# Altium integrated library AltiumLib.IntLib: 68 symbols
Pins are listed as number, name and electrical type; pins without a type are passive.

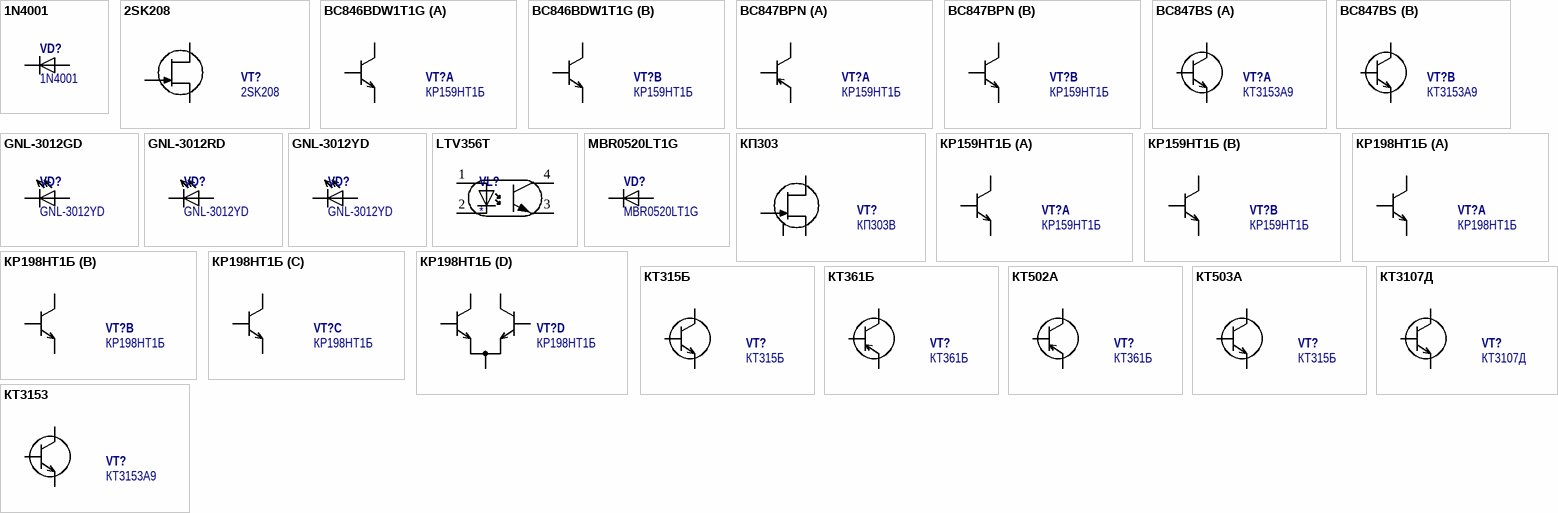
[diagram p0: symbols 1N4001 to КТ3153]

## 1N4001
designator VD?
name: Диод 1N4001; type: Диоды; def_comment: 1N4001
footprint D-015
pins: 1, 2

## 2SK208
designator VT?
N-транзистор; name: Транзистор 2SK208; type: Транзисторы; def_comment: 2SK208
footprint SOT95P230X110-3N (SOT23, 3-Leads, Body 2,90x2,30mm, Pitch 0,95mm, IPC Medium Density)
pins: 1 S, 2 D, 3 G

## BC846BDW1T1G
designator VT?, comment КР159НТ1Б
сборка 2 NPN-транзистора; name: Транзистор BC846BDW1T1G; type: Транзисторы; def_comment: КР159НТ1Б
footprint SOT65P210X110-6N (SOT23, 6-Leads, Body 2,00x2,10mm, Pitch 0,65mm, IPC Medium Density)
part A pins: 3 К, 4 Э, 5 Б
part B pins: 1 Э, 2 Б, 6 К

## BC847BPN
designator VT?, comment КР159НТ1Б
сборка PNP NPN-транзистора; name: Транзистор BC847BPN; type: Транзисторы; def_comment: КР159НТ1Б
footprint SOT65P210X110-6N (SOT23, 6-Leads, Body 2,00x2,10mm, Pitch 0,65mm, IPC Medium Density)
part A pins: 3 К, 4 Э, 5 Б
part B pins: 1 Э, 2 Б, 6 К

## BC847BS
designator VT?, comment КТ3153А9
NPN-транзистор; name: Транзистор BC847BS; type: Транзисторы; def_comment: КТ3153А9
footprint SOT65P210X110-6N (SOT23, 6-Leads, Body 2,00x2,10mm, Pitch 0,65mm, IPC Medium Density)
part A pins: 1 e1, 2 B1, 6 C1
part B pins: 3 C2, 4 e2, 5 B2

## GNL-3012GD
designator VD?, comment GNL-3012YD
желтый; name: Диод GNL-3012GD; type: Диоды; def_comment: GNL-3012YD
footprint GNL-3012GD
pins: 1, 2

## GNL-3012RD
designator VD?, comment GNL-3012YD
желтый; name: Диод GNL-3012RD; type: Диоды; def_comment: GNL-3012YD
footprint GNL-3012RD
pins: 1, 2

## GNL-3012YD
designator VD?
желтый; name: Диод GNL-3012YD; type: Диоды; def_comment: GNL-3012YD
footprint GNL-3012YD
pins: 1, 2

## LTV356T
designator VL?
def_comment: LTV356T; name: LTV356T; type: Оптрон Диодный
footprint SOP4
pins: 1 A, 2 K, 3 K, 4 K

## MBR0520LT1G
designator VD?
name: Диод MBR0520LT1G; type: Диоды; def_comment: MBR0520LT1G
footprint SODFL371X130-2N (SODFL, 2-Leads, Body 1,60x3,71mm, IPC Medium Density)
pins: 1, 2

## КП303
designator VT?, comment КП303В
полевой N транзистор; name: Транзистор КП303; type: Транзисторы; def_comment: КП303В
footprint k112
pins: 1 И, 2 С, 3 G, 4 E

## КР159НТ1Б
designator VT?
сборка 2 NPN-транзистора; name: Транзистор КР159НТ1Б; type: Транзисторы; def_comment: КР159НТ1Б
footprint DIP-8
part A pins: 2 К, 3 Б, 4 Э
part B pins: 5 Э, 6 Б, 7 К

## КР198НТ1Б
designator VT?
сборка 5 NPN-транзистора; name: Транзистор КР198НТ1Б; type: Транзисторы; def_comment: КР198НТ1Б
footprint DIP-14
part A pins: 1 К, 2 Э, 3 Б
part B pins: 4 К, 5 Э, 6 Б
part C pins: 7 К, 8 Э, 9 Б
part D pins: 10 К, 11 Б, 12 Э, 13 Б, 14 К

## КТ315Б
designator VT?
NPN-транзистор; name: Транзистор КТ315Б; type: Транзисторы; def_comment: КТ315Б
footprint TO-92
pins: 1 Э, 2 К, 3 Б

## КТ361Б
designator VT?
PNP-транзистор; name: Транзистор КТ361Б; type: Транзисторы; def_comment: КТ361Б
footprint TO-92
pins: 1 Э, 2 К, 3 Б

## КТ502А
designator VT?, comment КТ361Б
PNP-транзистор; name: Транзистор КТ502А; type: Транзисторы; def_comment: КТ361Б
footprint TO-92
pins: 1 К, 2 Б, 3 Э

## КТ503А
designator VT?, comment КТ315Б
NPN-транзистор; name: Транзистор КТ503А; type: Транзисторы; def_comment: КТ315Б
footprint TO-92
pins: 1 К, 2 Б, 3 Э

## КТ3107Д
designator VT?
NPN-транзистор; name: Транзистор КТ3107Д; type: Транзисторы; def_comment: КТ3107Д
footprint TO-92
pins: 1 К, 2 Б, 3 Э

## КТ3153
designator VT?, comment КТ3153А9
NPN-транзистор; name: Транзистор КТ3153А9; type: Транзисторы; def_comment: КТ3153А9
footprint SOT95P230X110-3N (SOT23, 3-Leads, Body 2,90x2,30mm, Pitch 0,95mm, IPC Medium Density)
pins: 1 G, 2 S, 3 D


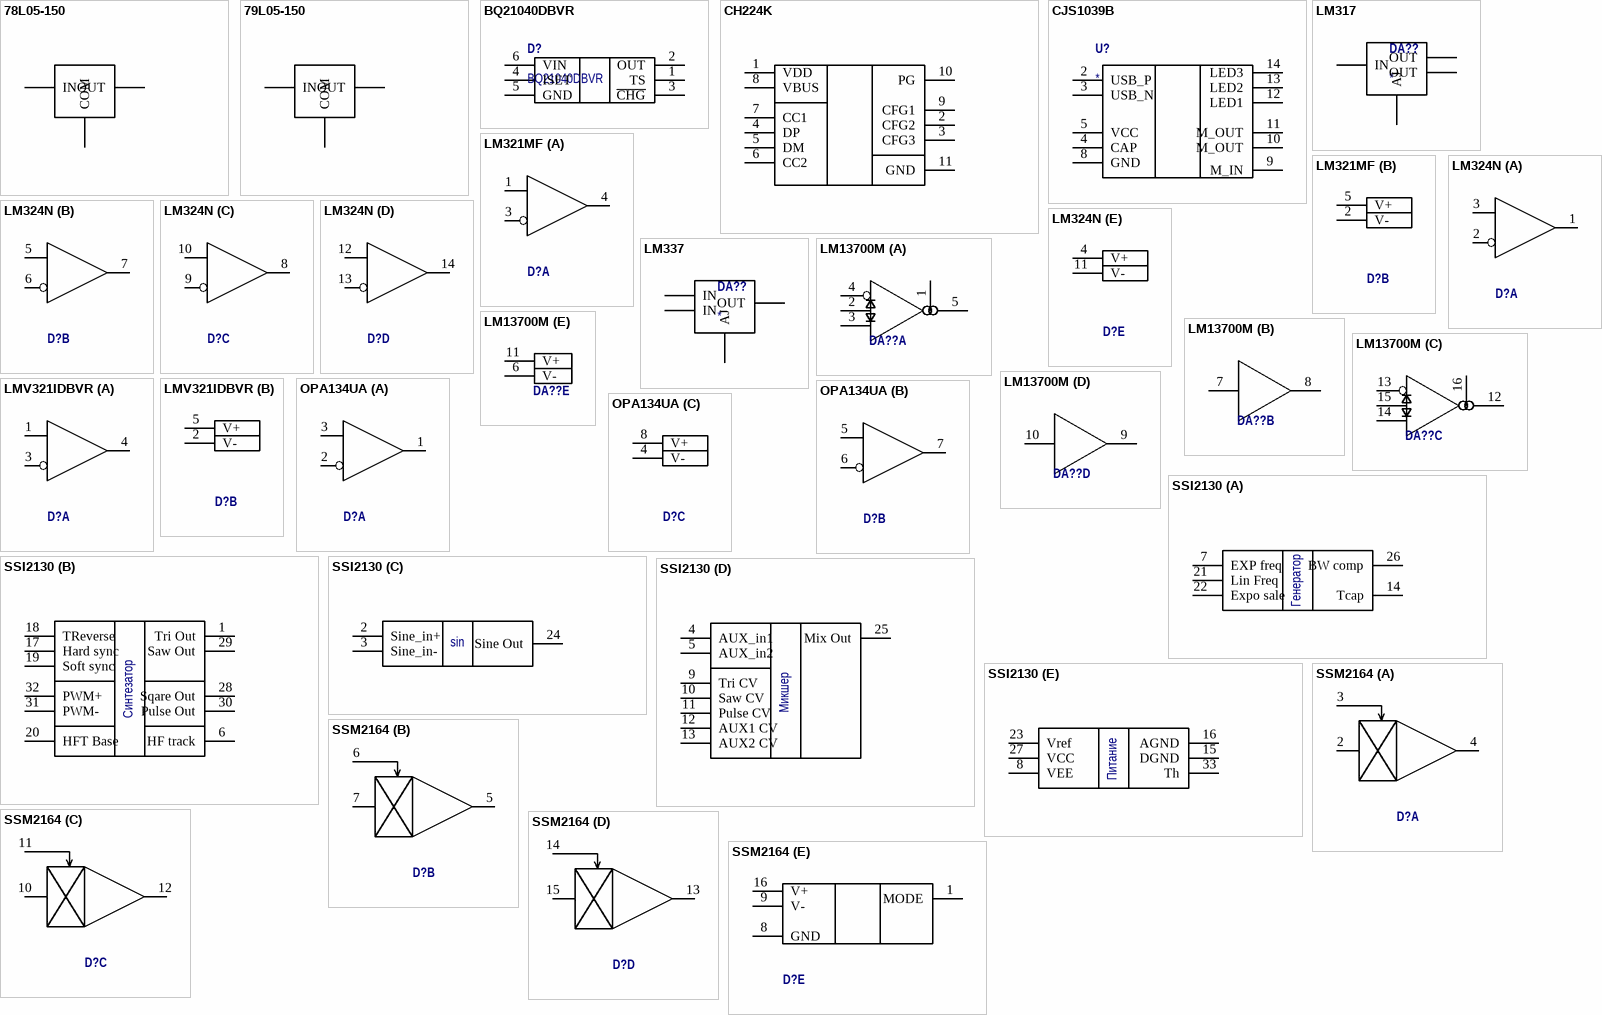
[diagram p1: symbols 78L05-150 to SSM2164]

## 78L05-150
designator D?, comment 78L05  (value not drawn)
Стабилизатор напряжения +5В 0.15А; planar: 1; rotation_offset: 90; name: *
footprint SOT89-150P410X160-3N (SOT89, 3-Leads, Body 4,50x2,45mm, Pitch 1,50mm, Lead Span 4,1mm, IPC Medium Density)
pins: 1 OUT, 2 COM, 3 IN

## 79L05-150
designator D?, comment 79L05  (value not drawn)
Стабилизатор напряжения -5В 0.15А; planar: 1; rotation_offset: 90; name: *
footprint SOT89-150P410X160-3N (SOT89, 3-Leads, Body 4,50x2,45mm, Pitch 1,50mm, Lead Span 4,1mm, IPC Medium Density)
pins: 1 COM, 2 IN, 3 OUT

## BQ21040DBVR
designator D?
Контроллер заряда литий-ионных/полимерных аккумуляторов, 1 Cell, 0.8А; type: Микросхемы; name: BQ21040DBVR
footprint SOT95P280X145-6N (SOT23, 6-Leads, Body 2,90x2,80mm, Pitch 0,95mm, IPC Medium Density)
pins: 1 TS, 2 OUT, 3 ~{CHG}, 4 ISET, 5 GND, 6 VIN

## CH224K
designator D?
CH224K USB QC/PD trigger; planar: 1; rotation_offset: 90; name: CH224K
footprint SOP100P590X180_HS-11N (SOP, 10-Leads, Body 4,90x3,80mm, Pitch 1,00mm, Thermal Pad 3,20x2,30mm, IPC Medium Density)
pins: 1 VDD, 2 CFG2, 3 CFG3, 4 DP, 5 DM, 6 CC2, 7 CC1, 8 VBUS, 9 CFG1, 10 PG, 11 GND

## CJS1039B
designator U?
name: CJS1039B; type: Микросхемы
footprint SOIC127P600-14N
pins: 2 USB_P, 3 USB_N, 4 CAP, 5 VCC, 8 GND, 9 M_IN, 10 M_OUT, 11 M_OUT, 12 LED1, 13 LED2, 14 LED3

## LM317
designator DA??
liner regulator; name: LM317AEMP/NOPB; note1: MC78M06BDT; note2: MC78M09BDTG; note3: MC78M15BDTG; type: Микросхемы
footprint SOT223-4N_3D
pins: 1 AJ, 2 OUT, 3 IN, 4 OUT

## LM321MF
designator D?, comment AMP  (value not drawn)
ОУ; name: LM321MF
footprint SOT23-5M
part A pins: 1 +, 3 -, 4 OUT
part B pins: 2 V-, 5 V+

## LM324N
designator D?, comment Quad AMP  (value not drawn)
Счетверенный ОУ; name: LM324NA
footprint SOIC127P600-14N
part A pins: 1 OUTA, 2 -, 3 +
part B pins: 5 +, 6 -, 7 OUTB
part C pins: 8 OUTC, 9 -, 10 +
part D pins: 12 +, 13 -, 14 OUTD
part E pins: 4 V+, 11 V-

## LM337
designator DA??
liner regulator; name: LM337IMP/NOPB; note1: MC78M06BDT; note2: MC78M09BDTG; note3: MC78M15BDTG; type: Микросхемы
footprint SOT223-4N_3D
pins: 1 AJ, 2 IN, 3 OUT, 4 IN

## LM13700M
designator DA??  (value not drawn)
Dual Operational Transconductance Amplifiers / With Linearizing Diodes and Buffers; name: LM324AM; type: Микросхемы
footprint SOIC127P600X175-16N (SOIC, 16-Leads, Body 9,90x3,85mm, Pitch 1,27mm, IPC Medium Density)
part A pins: 1 CCin, 2 CCin, 3 INA+, 4 INA-, 5 OUTA
part B pins: 7 INA, 8 OUTA
part C pins: 12 OUTB, 13 INB-, 14 INB+, 15 CCin, 16 CCin
part D pins: 9 OUTB, 10 INB
part E pins: 6 V-, 11 V+

## LMV321IDBVR
designator D?, comment AMP  (value not drawn)
ОУ; name: LMV321IDBVR
footprint SOT23-5M
part A pins: 1 +, 3 -, 4 OUT
part B pins: 2 V-, 5 V+

## OPA134UA
designator D?, comment Audio AMP  (value not drawn)
Сдвоенный аудио ОУ; name: OPA134UA
footprint SOIC127P600X175-8N (SOIC, 8-Leads, Body 4,90x3,90mm, Pitch 1,27mm, IPC Medium Density)
part A pins: 1 OUTA, 2 -, 3 +
part B pins: 5 +, 6 -, 7 OUTB
part C pins: 4 V-, 8 V+

## SSI2130
designator D?
name: SSI2130A; type: Микросхемы
footprint QFN40P400X400X80_HS-33N (QFN, 32-Leads, Body 4,00x4,00mm, Pitch 0,40mm, Thermal Pad 2,60x2,60mm, IPC Medium Density)
part A pins: 7 EXP freq, 14 Tcap, 21 Lin Freq, 22 Expo sale, 26 BW comp
part B pins: 1 Tri Out, 6 HF track, 17 Hard sync, 18 TReverse, 19 Soft sync, 20 HFT Base, 28 Sqare Out, 29 Saw Out, 30 Pulse Out, 31 PWM-, 32 PWM+
part C pins: 2 Sine_in+, 3 Sine_in-, 24 Sine Out
part D pins: 4 AUX_in1, 5 AUX_in2, 9 Tri CV, 10 Saw CV, 11 Pulse CV, 12 AUX1 CV, 13 AUX2 CV, 25 Mix Out
part E pins: 8 VEE, 15 DGND, 16 AGND, 23 Vref, 27 VCC, 33 Th
part A text: Генератор
part B text: Синтезатор
part C text: sin
part D text: Микшер
part E text: Питание

## SSM2164
designator D?, comment Quad VCA  (value not drawn)
Счетверенный усилитель, управляемый напряжением; name: LM324NA
footprint SOIC127P600X175-16N (SOIC, 16-Leads, Body 9,90x3,85mm, Pitch 1,27mm, IPC Medium Density)
part A pins: 2 INA, 3 VCA, 4 OUTA
part B pins: 5 OUTB, 6 VCB, 7 INB
part C pins: 10 INC, 11 VCC, 12 OUTC
part D pins: 13 OUTD, 14 VCD, 15 IND
part E pins: 1 MODE, 8 GND, 9 V-, 16 V+

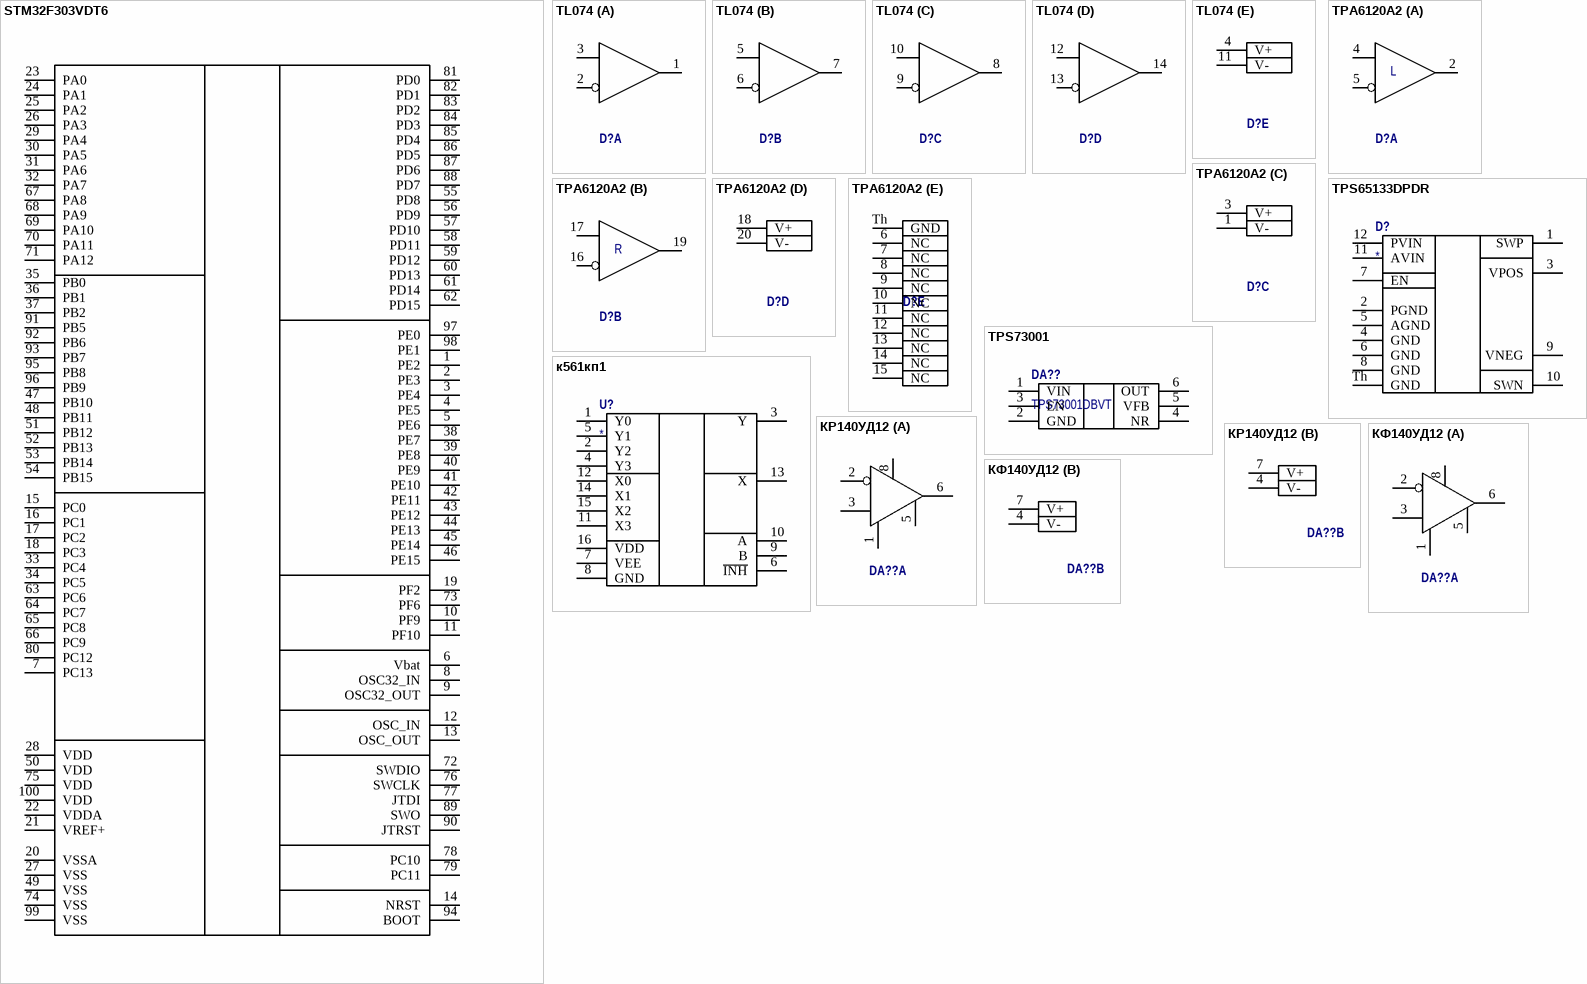
[diagram p2: symbols STM32F303VDT6 to КФ140УД12]

## STM32F303VDT6
designator D?
Микроконтроллер 32 бита, универсальный, ARM Cortex-M4, 72 МГц, 384 КБ, 64 КБ, 100 вывод(-ов), LQFP; planar: 1; rotation_offset: 90; name: *
footprint TSQFP50P1600X1600X160-100N (TSQFP, 100-Leads, Body 14.00x14.00mm, Pitch 0.50mm, IPC Medium Density)
pins: 1 PE2, 2 PE3, 3 PE4, 4 PE5, 5 PE6, 6 Vbat, 7 PC13, 8 OSC32_IN, 9 OSC32_OUT, 10 PF9, 11 PF10, 12 OSC_IN, 13 OSC_OUT, 14 NRST, 15 PC0, 16 PC1, 17 PC2, 18 PC3, 19 PF2, 20 VSSA, 21 VREF+, 22 VDDA, 23 PA0, 24 PA1, 25 PA2, 26 PA3, 27 VSS, 28 VDD, 29 PA4, 30 PA5, 31 PA6, 32 PA7, 33 PC4, 34 PC5, 35 PB0, 36 PB1, 37 PB2, 38 PE7, 39 PE8, 40 PE9, 41 PE10, 42 PE11, 43 PE12, 44 PE13, 45 PE14, 46 PE15, 47 PB10, 48 PB11, 49 VSS, 50 VDD, 51 PB12, 52 PB13, 53 PB14, 54 PB15, 55 PD8, 56 PD9, 57 PD10, 58 PD11, 59 PD12, 60 PD13, 61 PD14, 62 PD15, 63 PC6, 64 PC7, 65 PC8, 66 PC9, 67 PA8, 68 PA9, 69 PA10, 70 PA11, 71 PA12, 72 SWDIO, 73 PF6, 74 VSS, 75 VDD, 76 SWCLK, 77 JTDI, 78 PC10, 79 PC11, 80 PC12, 81 PD0, 82 PD1, 83 PD2, 84 PD3, 85 PD4, 86 PD5, 87 PD6, 88 PD7, 89 SWO, 90 JTRST, 91 PB5, 92 PB6, 93 PB7, 94 BOOT, 95 PB8, 96 PB9, 97 PE0, 98 PE1, 99 VSS, 100 VDD

## TL074
designator D?, comment Quad AMP  (value not drawn)
Счетверенный малошумящий ОУ; name: TL074CD
footprint SOIC127P600-14N
part A pins: 1 OUTA, 2 -, 3 +
part B pins: 5 +, 6 -, 7 OUTB
part C pins: 8 OUTC, 9 -, 10 +
part D pins: 12 +, 13 -, 14 OUTD
part E pins: 4 V+, 11 V-

## TPA6120A2
designator D?, comment Power AMP  (value not drawn)
Малошумящий усилитель для наушников; name: TL074CD
footprint SOIC127P1040X265_HS-21N (SOIC, 20-Leads, Body 12,82x7,52mm, Pitch 1,27mm, Thermal Pad 3,81x2,79mm, IPC Medium Density)
part A pins: 2 OUTA, 4 +, 5 -
part B pins: 16 -, 17 +, 19 OUTB
part C pins: 1 V-, 3 V+
part D pins: 18 V+, 20 V-
part E pins: 6 NC, 7 NC, 8 NC, 9 NC, 10 NC, 11 NC, 12 NC, 13 NC, 14 NC, 15 NC, Th GND
part A text: L
part B text: R

## TPS65133DPDR
designator D?
name: TPS65133DPDR; type: Микросхемы
footprint SON45P300X80_HS-13M (SON, 12-Leads, Body 3,00x3,00mm, Pitch 0,45mm, Thermal Pad 2,02x1,21mm, IPC Low Density)
pins: 1 SWP, 2 PGND, 3 VPOS, 4 GND, 5 AGND, 6 GND, 7 EN, 8 GND, 9 VNEG, 10 SWN, 11 AVIN, 12 PVIN, Th GND

## TPS73001
designator DA??, comment TPS73001DBVT
TPS730 Low-Noise, High PSRR, RF, 200-mA Low-Dropout Linear Regulators; name: TPS73001DBVT; type: Микросхемы
footprint SOT95P280X145-6N (SOT23, 6-Leads, Body 2,90x2,80mm, Pitch 0,95mm, IPC Medium Density)
pins: 1 VIN, 2 GND, 3 EN, 4 NR, 5 VFB, 6 OUT

## к561кп1
designator U?
мультиплексор; name: к561кп1; type: Микросхемы
footprint DIP-16
footprint SOIC127P600X175-16N (SOIC, 16-Leads, Body 9,90x3,85mm, Pitch 1,27mm, IPC Medium Density)
pins: 1 Y0, 2 Y2, 3 Y, 4 Y3, 5 Y1, 6 ~{INH}, 7 VEE, 8 GND, 9 B, 10 A, 11 X3, 12 X0, 13 X, 14 X1, 15 X2, 16 VDD

## КР140УД12
designator DA??  (value not drawn)
Микромощный операционный усилитель с регулируемым потреблением мощности; name: КФ140УД12; type: Микросхемы
footprint DIP-8
part A pins: 1 bal, 2 INA-, 3 INA+, 5 bal, 6 OUTA, 8 Set_curr
part B pins: 4 V-, 7 V+

## КФ140УД12
designator DA??  (value not drawn)
Микромощный операционный усилитель с регулируемым потреблением мощности; name: КФ140УД12; type: Микросхемы
footprint SOIC127P600X175-8N (SOIC, 8-Leads, Body 4,90x3,90mm, Pitch 1,27mm, IPC Medium Density)
part A pins: 1 bal, 2 INA-, 3 INA+, 5 bal, 6 OUTA, 8 Set_curr
part B pins: 4 V-, 7 V+


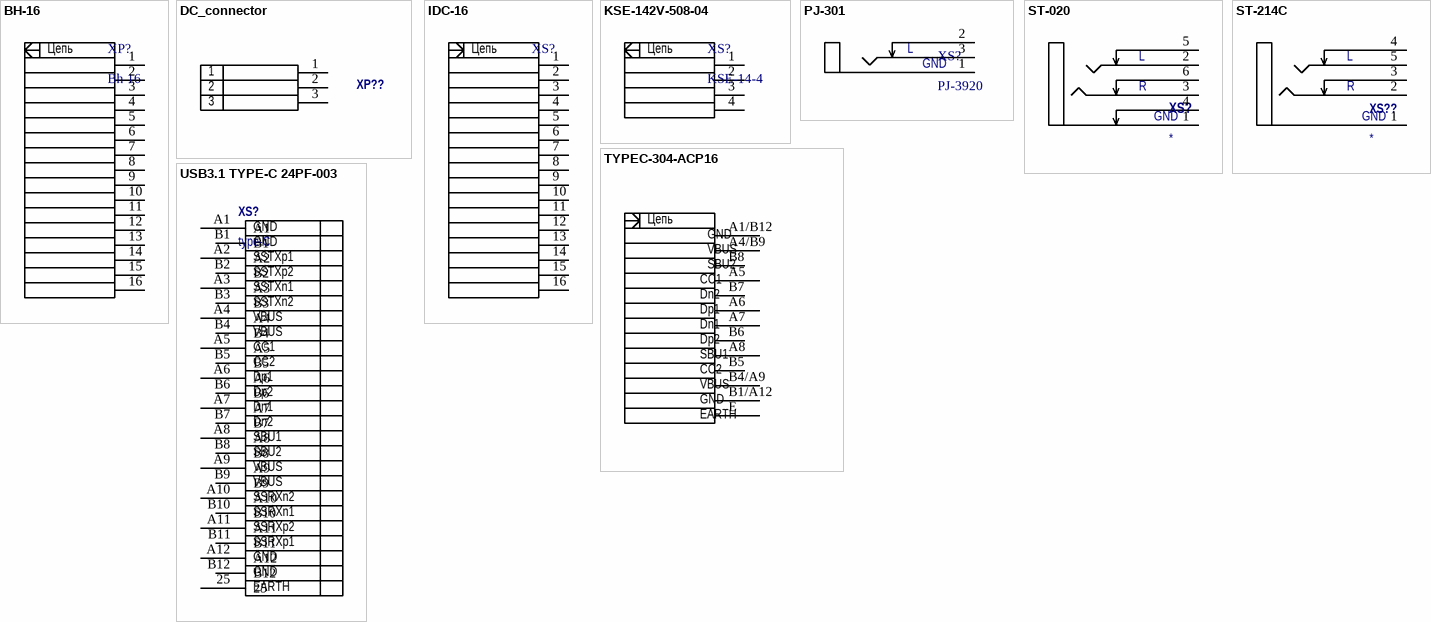
[diagram p3: symbols BH-16 to USB3.1 TYPE-C 24PF-003]

## BH-16
designator XP?, comment Bh 16
Вилка 16 контактов
footprint HDR2X8 - BH (Connector; Header; 8x2 Position)
pins: 1, 2, 3, 4, 5, 6, 7, 8, 9, 10, 11, 12, 13, 14, 15, 16
text: Цепь

## DC_connector
designator XP??
name: Вилка PLS2; type: Вилки
footprint DS-210
pins: 1, 2, 3

## IDC-16
designator XS?  (value not drawn)  (mechanical)
Розетка 16 контактов под шлейф
pins: 1, 2, 3, 4, 5, 6, 7, 8, 9, 10, 11, 12, 13, 14, 15, 16
text: Цепь

## KSE-142V-508-04
designator XS?, comment KSE-14-4
Клемма 4 контакта
footprint KSE-14-4
pins: 1, 2, 3, 4
text: Цепь

## PJ-301
designator XS?, comment PJ-3920
Розетка 3.5 мм моно
footprint PJ-301
pins: 1, 2, 3
text: L; GND

## ST-020
designator XS?
name: ST-020
footprint ST-020
footprint ST-020 - DWN
pins: 1 GND, 2 TIP, 3 RING, 4 GND_NC, 5 GND_NC, 6 RING_NC
text: L; R

## ST-214C
designator XS??
name: Розетка ST-214C; type: Розетки
footprint ST-214C
pins: 1, 2, 3, 4, 5
text: L; R; GND

## TYPEC-304-ACP16
designator XS?
3A 1 Horizontal attachment 16P Female -40~+85 Type-C SMD USB Connectors ROHS; name: TYPEC-304-ACP16; planar: 1; rotation_offset: 90
footprint TYPEC-304-ACP16 (3A 1 Horizontal attachment 16P Female -40~+85 Type-C SMD USB Connectors ROHS)
pins: A1/B12 A1/B1, A4/B9, A5, A6, A7, A8, B1/A12, B4/A9, B5, B6, B7, B8, E
text: Цепь; GND; VBUS; SBU2; CC1; Dn2; Dp1; Dn1; Dp2; SBU1; CC2; EARTH

## USB3.1 TYPE-C 24PF-003
designator XS?, comment type-C
name: USB3.1 TYPE-C 24PF-003; type: Розетки
footprint type c 24F-002
pins: 25, A1, A2, A3, A4, A5, A6, A7, A8, A9, A10, A11, A12, B1, B2, B3, B4, B5, B6, B7, B8, B9, B10, B11, B12
text: GND; SSTXp1; SSTXp2; SSTXn1; SSTXn2; VBUS; CC1; CC2; Dp1; Dp2; Dn1; Dn2; SBU1; SBU2; SSRXn2; SSRXn1; SSRXp2; SSRXp1; EARTH


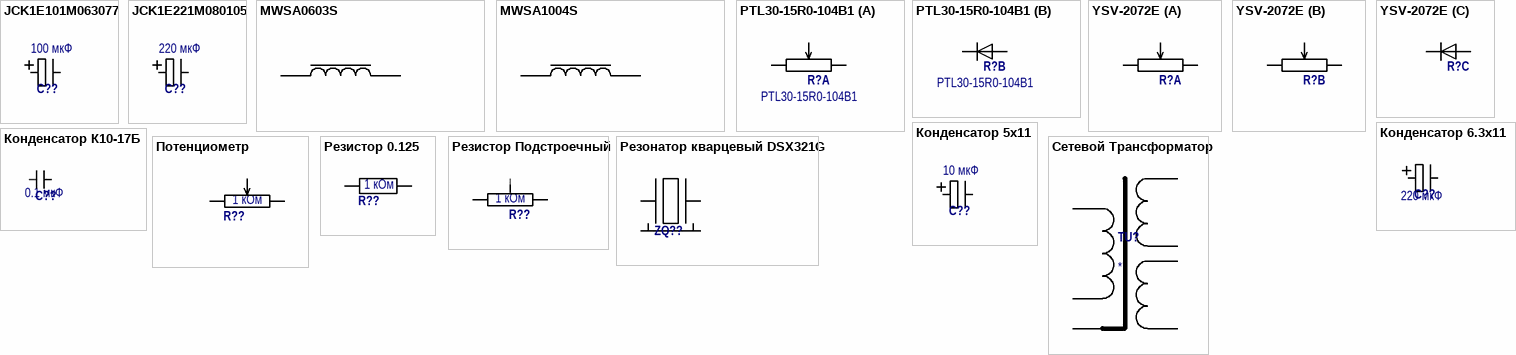
[diagram p4: symbols JCK1E101M063077 to Сетевой Трансформатор]

## JCK1E101M063077
designator C??  value 100 мкФ
Чип конденсатор; name: JCK1E101M063077; dopusk: ±10%; napr: 25 В; d_type: 35; k_type: K50; type: Конденсатор
footprint CAPAE6866X77M (Aluminum Electrolytic Capacitor, Body 6,60x6,60x7,70mm, IPC Low Density)
pins: 1, 2

## JCK1E221M080105
designator C??  value 220 мкФ
Чип конденсатор; name: JCK1E221M080105; dopusk: ±10%; napr: 25 В; d_type: 35; k_type: K50; type: Конденсатор
footprint CAPAE8482X105M (Aluminum Electrolytic Capacitor, Body 8.25x8.25x10.50mm, IPC Low Density)
pins: 1, 2

## MWSA0603S
designator L?
name: MWSA0603S-100MT; planar: 1; rotation_offset: 90
footprint INDC6650X04N (Chip Inductorr, 2-Leads, 0603S, IPC Medium Density)
pins: 1, 2

## MWSA1004S
designator L?
name: MWSA1004S-330MT; planar: 1; rotation_offset: 90
footprint INDC1040X04N (Chip Inductorr, 2-Leads, 1004S, IPC Medium Density)
pins: 1, 2

## PTL30-15R0-104B1
designator R?  name: PTL30-15R0-104B1
value: 100 кОм; type: Резистор
footprint PTL30
part A pins: 1, 2, 3
part B pins: B, E

## YSV-2072E
designator R?
value: 10 кОм; type: Резистор
footprint Q-4518
part A pins: 1, 2, 3
part B pins: 4, 5, 6
part C pins: 7, 8

## Конденсатор 5x11
designator C??  value 10 мкФ
Чип конденсатор; name: k_type-35-16 В-10 мкФ ±10%; dopusk: ±10%; napr: 16 В; d_type: 35; k_type: K50; type: Конденсатор
footprint CAP 5x11
pins: 1, 2

## Конденсатор 6.3x11
designator C??  value 220 мкФ
Чип конденсатор; name: k_type-35-16 В-220 мкФ ±10%; dopusk: ±10%; napr: 16 В; d_type: 35; k_type: K50; type: Конденсатор
footprint CAP 6.3x11
footprint CAP 6.3x11-R
pins: 1, 2

## Конденсатор К10-17Б
designator C??  value 0.1 мкФ
Чип конденсатор; name: К10-17Б-X7R-50 В-0.1 мкФ ±10%; dopusk: ±10%; napr: 50 В; d_type: X7R; type: Конденсатор
footprint CAP_JYM
footprint CAP 2.5x6.5x7.2 box
pins: 1, 2

## Потенциометр
designator R??  value 1 кОм
type: Резистор
footprint 16K1-B100K_WIRE
footprint RV09
footprint SL-45V1
footprint RK09
pins: 1, 2, 3

## Резистор 0.125
designator R??  value 1 кОм
name: С1-4 -1 кОм ±5%; dopusk: ±5%; type: Резистор
footprint RES C1-4 0.125
pins: 1, 2

## Резистор Подстроечный
designator R??, comment 1 кОм
type: Резистор; value: 1 кОм
footprint CA6
footprint 3296W-1 (Подстроечный резистор)
pins: 1, 2, 3

## Резонатор кварцевый DSX321G
designator ZQ??
DSX321G SMD Crystals; name: DSX321G; type: Резонаторы
footprint DSX321G (Footprint not found)
pins: 1, 2, 3, 4

## Сетевой Трансформатор
designator TU?
name: ТТП-15 2x12
footprint TTP15
pins: 1, 2, 3 +12V, 4 0V, 5 -12, 6 -13, 7 -14


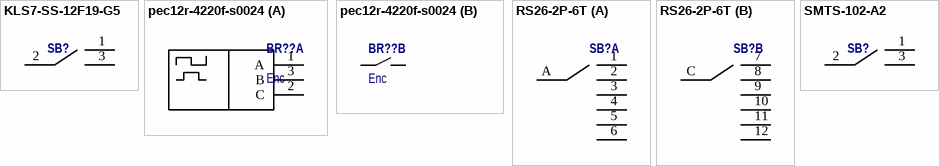
[diagram p5: symbols KLS7-SS-12F19-G5 to SMTS-102-A2]

## KLS7-SS-12F19-G5
designator SB?
def.commrnt: KLS7-SS-12F19-G5; name: KLS7-SS-12F19-G5; type: Тумблер
footprint KLS7-SS
pins: 1, 2, 3

## pec12r-4220f-s0024
designator BR??, comment Enc
Encoder; def.commrnt: pec12r-4220f-s0024A; name: pec12r-4220f-s0024A; type: Энкодер
footprint PEC12R
part A pins: 1 A, 2 C, 3 B
part B pins: 4, 5

## RS26-2P-6T
designator SB?  (value not drawn)
def.commrnt: RS26-2P-6TA; name: RS26-2P-6TA; type: Галетный переключатель
footprint RS26-2P-6T
part A pins: 1, 2, 3, 4, 5, 6, A
part B pins: 7, 8, 9, 10, 11, 12, C

## SMTS-102-A2
designator SB?
def.commrnt: SMTS-102-A2; name: SMTS-102-A2; type: Тумблер
footprint SMTS-102-A2
pins: 1, 2, 3